# Altium schematic symbol library AA_Symbols.SchLib: 1017 symbols (part 2 of 7)
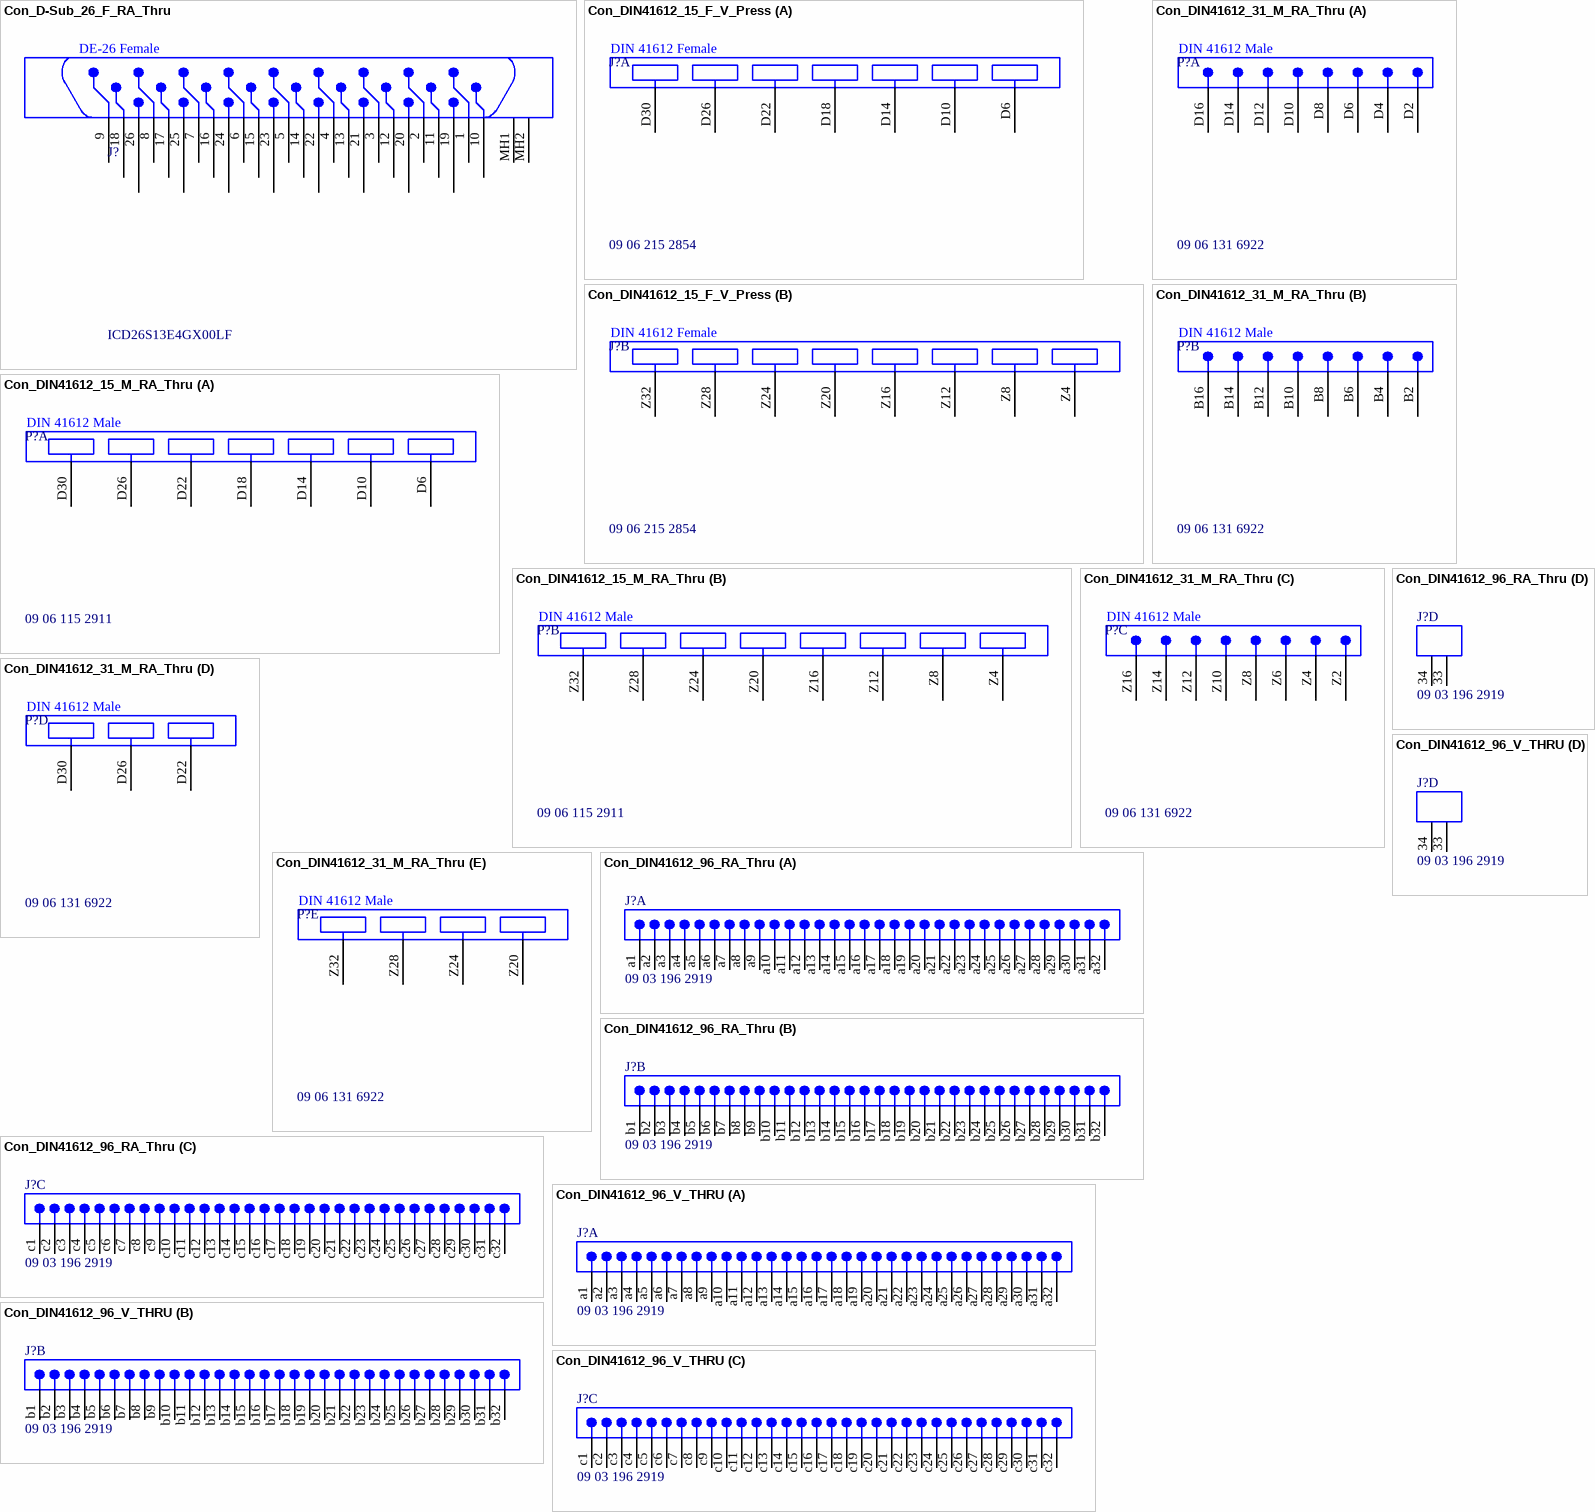
[diagram p43: symbols Con_D-Sub_26_F_RA_Thru to Con_DIN41612_96_V_THRU]

## Con_DIN41612_31_M_RA_Thru
designator P?, comment 09 06 131 6922
Connector, DIN 41612, 7 Blade + 24 Position, Male (Card Side), Right Angle, Through Hole; Manufacturer: Harting; Outset P/N: PN-0001618; Manufacturer P/N: 09 06 131 6922; Value: 09 06 131 6922
footprint 09061316922_DIN41612-24+7pin (09 06 131 6922, Board-to-Board Connector, Eurocard VME, Right Angle, 5-Row, 5.08mm and 2.54mm Pitch, 31-Position)
part A pins: D2, D4, D6, D8, D10, D12, D14, D16
part B pins: B2, B4, B6, B8, B10, B12, B14, B16
part C pins: Z2, Z4, Z6, Z8, Z10, Z12, Z14, Z16
part D pins: D22, D26, D30
part E pins: Z20, Z24, Z28, Z32
part A text: DIN 41612 Male
part B text: DIN 41612 Male
part C text: DIN 41612 Male
part D text: DIN 41612 Male
part E text: DIN 41612 Male

## Con_DIN41612_96_RA_Thru
designator J?, comment 09 03 196 2919
Connector, DIN 41612, 96 Position, Right Angle, Through Hole; Manufacturer: Molex; Manufacturer P/N: 850030567; Outset P/N: 0000041
footprint 0903196x919 (DIN 41612, 96 Position, Right angle)
part A pins: a1, a2, a3, a4, a5, a6, a7, a8, a9, a10, a11, a12, a13, a14, a15, a16, a17, a18, a19, a20, a21, a22, a23, a24, a25, a26, a27, a28, a29, a30, a31, a32
part B pins: b1, b2, b3, b4, b5, b6, b7, b8, b9, b10, b11, b12, b13, b14, b15, b16, b17, b18, b19, b20, b21, b22, b23, b24, b25, b26, b27, b28, b29, b30, b31, b32
part C pins: c1, c2, c3, c4, c5, c6, c7, c8, c9, c10, c11, c12, c13, c14, c15, c16, c17, c18, c19, c20, c21, c22, c23, c24, c25, c26, c27, c28, c29, c30, c31, c32
part D pins: 33 MH1 "Mounting Fixture", 34 MH2 "Mounting Fixture"

## Con_DIN41612_96_V_THRU
designator J?, comment 09 03 196 2919
Connector, DIN 41612, 96 Position, Vertical Through Hole; Manufacturer: Molex; Manufacturer P/N: 850420270; Outset P/N: 0000042
footprint 0903296x821 (Connector; DIN 41612, Type C, Thru-Hole; Rows a+b+c, 96 Position; Vertical)
part A pins: a1, a2, a3, a4, a5, a6, a7, a8, a9, a10, a11, a12, a13, a14, a15, a16, a17, a18, a19, a20, a21, a22, a23, a24, a25, a26, a27, a28, a29, a30, a31, a32
part B pins: b1, b2, b3, b4, b5, b6, b7, b8, b9, b10, b11, b12, b13, b14, b15, b16, b17, b18, b19, b20, b21, b22, b23, b24, b25, b26, b27, b28, b29, b30, b31, b32
part C pins: c1, c2, c3, c4, c5, c6, c7, c8, c9, c10, c11, c12, c13, c14, c15, c16, c17, c18, c19, c20, c21, c22, c23, c24, c25, c26, c27, c28, c29, c30, c31, c32
part D pins: 33 MH1 "Mounting Fixture", 34 MH2 "Mounting Fixture"

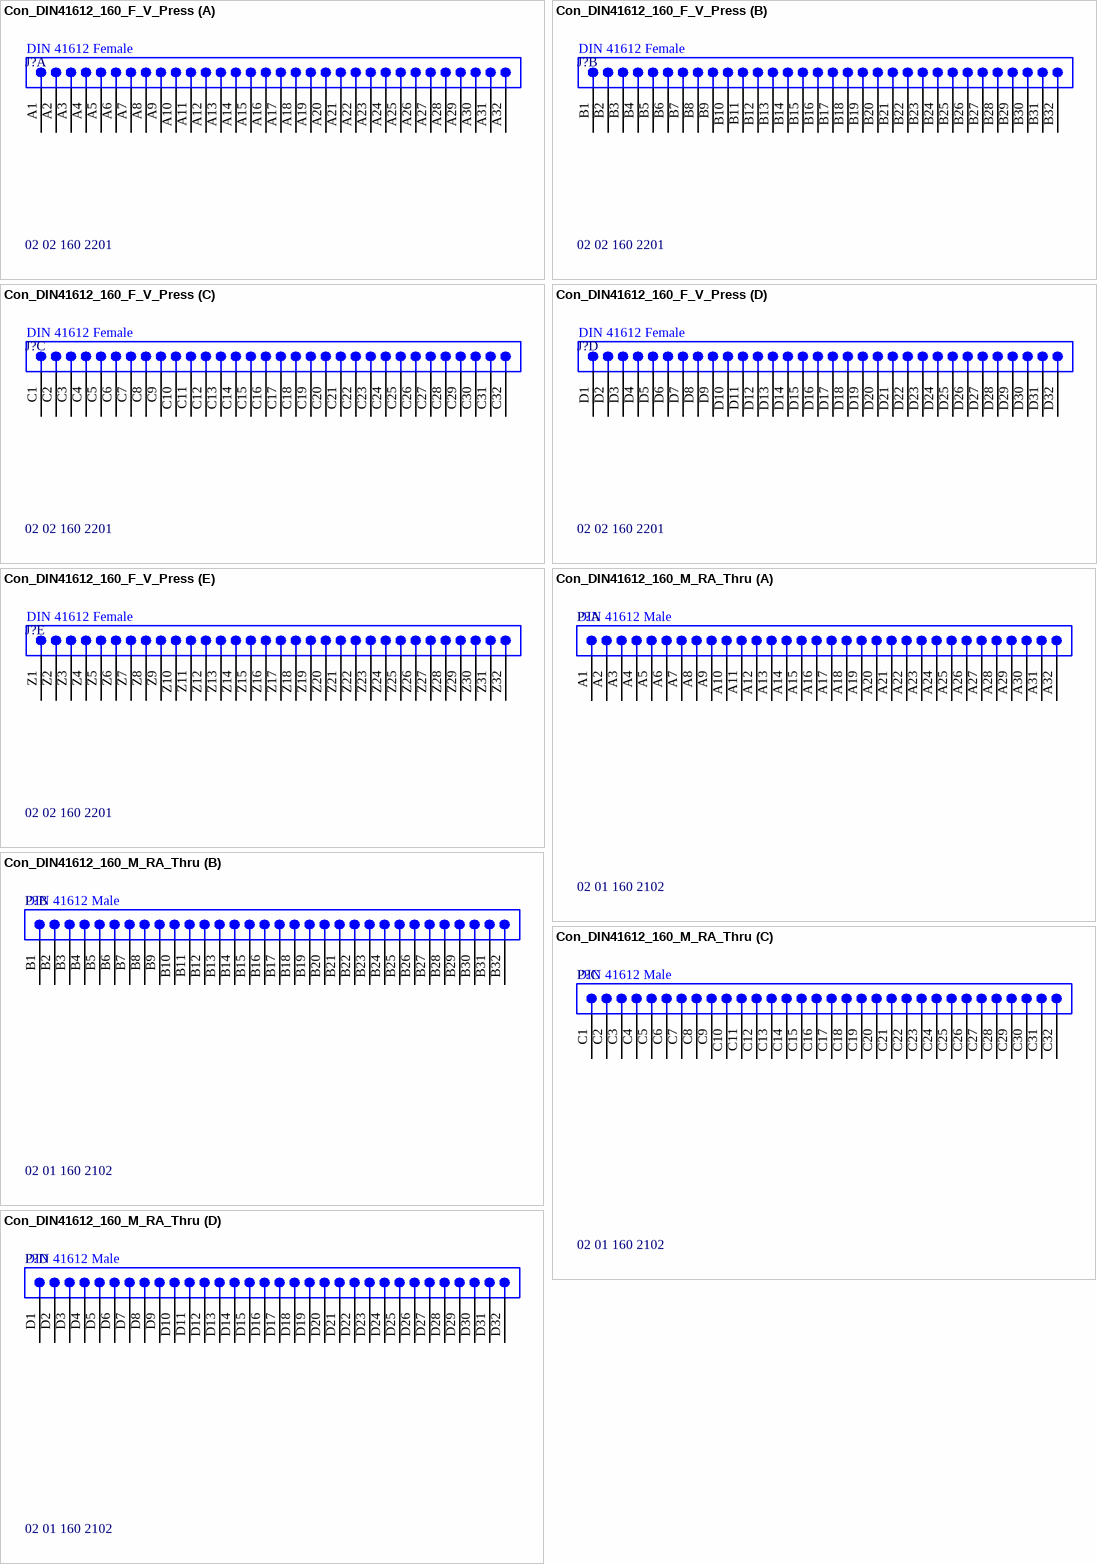
[diagram p5: symbols Con_DIN41612_160_F_V_Press to Con_DIN41612_160_M_RA_Thru]

## Con_DIN41612_160_F_V_Press
designator J?, comment 02 02 160 2201
Connector, DIN 41612, 160 Position, Female (Backplane Side), Vertical, Press Fit; Manufacturer: Harting; Outset P/N: PN-0001619; Manufacturer P/N: 02 02 160 2201; Value: 02 02 160 2201
footprint 02021602201_DIN41612-160pin (02 02 160 2201, Board-to-Board Connector, Eurocard VME, Vertical, 5-Row, Pitch 2.54mm, 160-Position)
part A pins: A1, A2, A3, A4, A5, A6, A7, A8, A9, A10, A11, A12, A13, A14, A15, A16, A17, A18, A19, A20, A21, A22, A23, A24, A25, A26, A27, A28, A29, A30, A31, A32
part B pins: B1, B2, B3, B4, B5, B6, B7, B8, B9, B10, B11, B12, B13, B14, B15, B16, B17, B18, B19, B20, B21, B22, B23, B24, B25, B26, B27, B28, B29, B30, B31, B32
part C pins: C1, C2, C3, C4, C5, C6, C7, C8, C9, C10, C11, C12, C13, C14, C15, C16, C17, C18, C19, C20, C21, C22, C23, C24, C25, C26, C27, C28, C29, C30, C31, C32
part D pins: D1, D2, D3, D4, D5, D6, D7, D8, D9, D10, D11, D12, D13, D14, D15, D16, D17, D18, D19, D20, D21, D22, D23, D24, D25, D26, D27, D28, D29, D30, D31, D32
part E pins: Z1, Z2, Z3, Z4, Z5, Z6, Z7, Z8, Z9, Z10, Z11, Z12, Z13, Z14, Z15, Z16, Z17, Z18, Z19, Z20, Z21, Z22, Z23, Z24, Z25, Z26, Z27, Z28, Z29, Z30, Z31, Z32
part A text: DIN 41612 Female
part B text: DIN 41612 Female
part C text: DIN 41612 Female
part D text: DIN 41612 Female
part E text: DIN 41612 Female

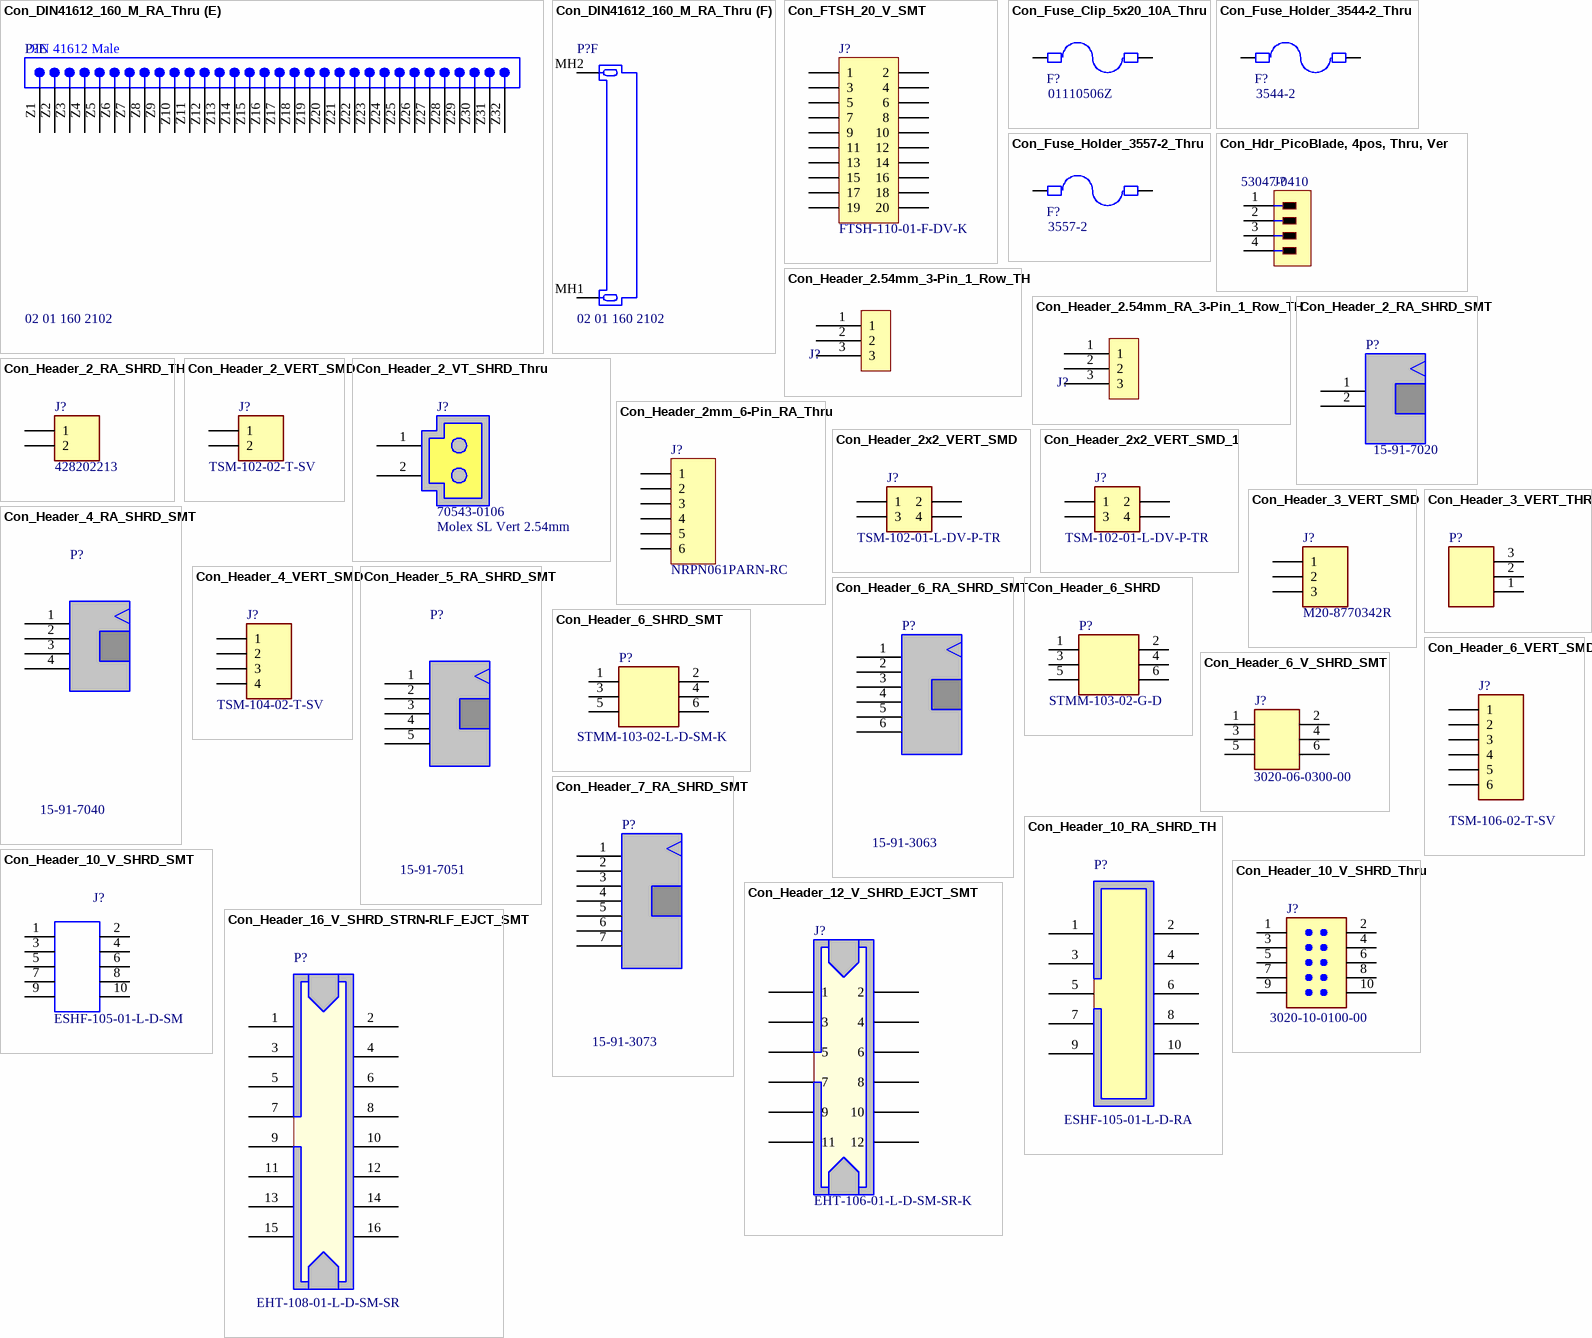
[diagram p6: symbols Con_DIN41612_160_M_RA_Thru to Con_Header_16_V_SHRD_STRN-RLF_EJCT_SMT]

## Con_DIN41612_160_M_RA_Thru
designator P?, comment 02 01 160 2102
Connector, DIN 41612, 160 Position, Male (Card Side), Right Angle, Through Hole; Manufacturer: Harting; Outset P/N: PN-0001620; Manufacturer P/N: 02 01 160 2102; Value: 02 01 160 2102
footprint 02011602102_DIN41612-160pin (02 01 160 2102, Board-to-Board Connector, Eurocard VME, Right Angle, 5-Row, Pitch 2.54mm, 160-Position)
part A pins: A1, A2, A3, A4, A5, A6, A7, A8, A9, A10, A11, A12, A13, A14, A15, A16, A17, A18, A19, A20, A21, A22, A23, A24, A25, A26, A27, A28, A29, A30, A31, A32
part B pins: B1, B2, B3, B4, B5, B6, B7, B8, B9, B10, B11, B12, B13, B14, B15, B16, B17, B18, B19, B20, B21, B22, B23, B24, B25, B26, B27, B28, B29, B30, B31, B32
part C pins: C1, C2, C3, C4, C5, C6, C7, C8, C9, C10, C11, C12, C13, C14, C15, C16, C17, C18, C19, C20, C21, C22, C23, C24, C25, C26, C27, C28, C29, C30, C31, C32
part D pins: D1, D2, D3, D4, D5, D6, D7, D8, D9, D10, D11, D12, D13, D14, D15, D16, D17, D18, D19, D20, D21, D22, D23, D24, D25, D26, D27, D28, D29, D30, D31, D32
part E pins: Z1, Z2, Z3, Z4, Z5, Z6, Z7, Z8, Z9, Z10, Z11, Z12, Z13, Z14, Z15, Z16, Z17, Z18, Z19, Z20, Z21, Z22, Z23, Z24, Z25, Z26, Z27, Z28, Z29, Z30, Z31, Z32
part F pins: MH1, MH2
part A text: DIN 41612 Male
part B text: DIN 41612 Male
part C text: DIN 41612 Male
part D text: DIN 41612 Male
part E text: DIN 41612 Male

## Con_FTSH_20_V_SMT
designator J?, comment FTSH-110-01-F-DV-K
Connector, FTSH, 20 Position, Vertical, SMT; Manufacturer: Samtec; Outset P/N: 0000043; Manufacturer P/N: FTSH-110-01-F-DV-K
footprint FTSH-110-01-F-DV-K
pins: 1, 2, 3, 4, 5, 6, 7, 8, 9, 10, 11, 12, 13, 14, 15, 16, 17, 18, 19, 20

## Con_Fuse_Clip_5x20_10A_Thru
designator F?  Manufacturer P/N: 01110506Z
Connector, Fuse Clip, 5x20, 10A, Through Hole; Manufacturer: Littelfuse Inc; Outset P/N: 0000045
footprint 5X20_CLIP_111506
pins: 1 A, 2 B

## Con_Fuse_Holder_3544-2_Thru
designator F?  Manufacturer P/N: 3544-2
Connector, Fuse Holder, 3544-2, Mini 30A, Through Hole; Manufacturer: Keystone Electronics; Outset P/N: 0000046
footprint 3544-2 (Miniature 30A Fuse Holder)
pins: 1 A, 2 B

## Con_Fuse_Holder_3557-2_Thru
designator F?  Manufacturer P/N: 3557-2
Connector, Fuse Holder, 3557-2, Mini 891 Fuse, Through Hole; Manufacturer: Keystone Electronics; Outset P/N: 0000047
footprint 3557-2 (Mini 891 Fuse Holder)
pins: 1 A, 2 B

## Con_Hdr_PicoBlade, 4pos, Thru, Ver
designator J?, comment value 53047-0410  (hidden comment: HDR, 1X4, PicoBlade, Thru, Ver)
Connector, Hdr, PicoBlade, 4pos, Thru, Ver; Manufacturer: Molex; Outset P/N: PN-0002502; Manufacturer P/N: 53047-0410; Distributor: Digi-Key
footprint CON_HDR_1X4_PICOBL_53047-0410 (Con, Hdr, 1x4, PicoBlade, Thru, Vert)
pins: 1, 2, 3, 4

## Con_Header_2.54mm_3-Pin_1_Row_TH
designator J?, comment 0022284035  (value not drawn)
Connector, Header, 2.54mm Pitch, 3-Pin, 1-Row, TH, Straight, Unshrouded; Manufacturer: Molex; Outset P/N: PN-0006346; Manufacturer P/N: 0022284035
footprint HEADER_3-POS_1-ROW_TH (Header, 3-Pos, 1-Row, TH)
pins: 1, 2, 3

## Con_Header_2.54mm_RA_3-Pin_1_Row_TH
designator J?, comment 0022288034  (value not drawn)
Connector, Header, 2.54mm Pitch, 3-Pin, 1-Row, TH, Straight, Unshrouded; Manufacturer: Molex; Outset P/N: PN-0008353; Manufacturer P/N: 0022288034
footprint 22-28-8034_MOL
pins: 1, 2, 3

## Con_Header_2_RA_SHRD_SMT
designator P?, comment 15-91-7020
Connector, Header, 2x1Position, Right Angle, Shrowded, Surface Mount; Manufacturer: Molex; Outset P/N: PN-0001746; Manufacturer P/N: 15-91-7020; Value: 15-91-7020
footprint 15-91-7020_2.5mm2pin (Footprint not found)
pins: 1, 2

## Con_Header_2_RA_SHRD_TH
designator J?, comment 428202213
Connector, Header, 2x1 Position, 0.394" (10mm) Pitch, Right Angle, Shrouded, Through Hole; Manufacturer: Molex; Outset P/N: PN-0007272; Manufacturer P/N: 428202213; Value: 428202213
footprint CON_2_RA_MiniFit_SR
pins: 1, 2

## Con_Header_2_VERT_SMD
designator J?, comment TSM-102-02-T-SV
Connector, Header Surface Mount 2 position 0.100" (2.54mm); Manufacturer: Samtec Inc.; Outset P/N: PN-0008198; Manufacturer P/N: TSM-102-02-T-SV; Supplier 1: Digi-Key; Supplier Part Number 1: SAM15347-ND; Value: TSM-102-02-T-SV
footprint SAMTEC_TSM-102-02-T-SV
pins: 1, 2

## Con_Header_2_VT_SHRD_Thru
designator J?, comment Manufacturer P/N: 70543-0106  (hidden comment: Molex SL Vert 2.54mm)
Connector 2.54mm SL, Header, 2x1 Position, Vertical, Shrouded, Through Hole; Outset P/N: PN-0001759; Manufacturer: Molex; Value: Molex SL Vert 2.54mm
footprint 705430001_2.54mm2pin (Footprint not found)
pins: 1, 2

## Con_Header_2mm_6-Pin_RA_Thru
designator J?, comment NRPN061PARN-RC
Connector, Header, 2mm, 6 Position, Right Angle, Through-Hole; Manufacturer: Sullins Connector Solutions; Outset P/N: 0000048; Manufacturer P/N: NRPN061PARN-RC
footprint HEADER_6PIN_2MM_RA
pins: 1, 2, 3, 4, 5, 6

## Con_Header_2x2_VERT_SMD
designator J?, comment TSM-102-01-L-DV-P-TR
Connector Header Surface Mount 4 position 0.100" (2.54mm); Manufacturer: Samtec Inc.; Outset P/N: PN-0008386; Manufacturer P/N: TSM-102-01-L-DV-P-TR; Supplier 1: Digi-Key; Supplier Part Number 1: SAM15347-ND; Value: TSM-102-01-L-DV-P-TR
pins: 1, 2, 3, 4

## Con_Header_2x2_VERT_SMD_1
designator J?, comment TSM-102-01-L-DV-P-TR
Connector Header Surface Mount 4 position 0.100" (2.54mm); Manufacturer: Samtec Inc.; Manufacturer P/N: TSM-102-02-T-SV; Supplier 1: Digi-Key; Supplier Part Number 1: SAM15347-ND; Value: TSM-102-01-L-DV-P-TR
pins: 1, 2, 3, 4

## Con_Header_3_VERT_SMD
designator J?, comment M20-8770342R
Connector, Header Surface Mount 3 position 0.100" (2.54mm); Manufacturer: Harwin Inc.; Outset P/N: PN-0008196; Manufacturer P/N: M20-8770342R; Value: M20-8770342R
footprint CON_VERT_3
pins: 1, 2, 3

## Con_Header_3_VERT_THRU
designator P?, comment 70543-0107  (value not drawn)
CONN HEADER VERT 3POS 2.54MM; Manufacturer: Molex; Outset P/N: PN-0008338; TEMPERATURE: -40°C ~ 105°C; VALUE: 70543-0107; Manufacturer P/N: 70543-0107
footprint 70543-0107
pins: 1, 2, 3

## Con_Header_4_RA_SHRD_SMT
designator P?, comment 15-91-7040
Connector, Header, 4x1Position, Right Angle, Shrowded, Surface Mount; Manufacturer: Molex; Outset P/N: PN-0001740; Manufacturer P/N: 15-91-7040; Value: 15-91-7040
footprint 15-91-7040_2.5mm4pin (Footprint not found)
pins: 1, 2, 3, 4

## Con_Header_4_VERT_SMD
designator J?, comment TSM-104-02-T-SV
Connector, Header Surface Mount 4 position 0.100" (2.54mm); Manufacturer: Samtec Inc.; Outset P/N: PN-0008199; Supplier 1: Samtec; Manufacturer P/N: TSM-104-02-T-SV; Supplier Part Number 1: TSM-104-02-T-SV; Value: TSM-104-02-T-SV
footprint SAMTEC_TSM-104-02-T-SV
pins: 1, 2, 3, 4

## Con_Header_5_RA_SHRD_SMT
designator P?, comment 15-91-7051
Connector, Header, 5x1Position, Right Angle, Shrowded, Surface Mount; Manufacturer: Molex; Outset P/N: PN-0001748; Manufacturer P/N: 15-91-7051; Value: 15-91-7051
footprint 15-91-7051_2.5mm5pin (Connector, Header, 5x1Position, Right Angle, Shrowded, Surface Mount, Press-fit Pegs)
pins: 1, 2, 3, 4, 5

## Con_Header_6_RA_SHRD_SMT
designator P?, comment 15-91-3063
Connector, Header, 6x1Position, Right Angle, Shrowded, Surface Mount; Manufacturer: Molex; Outset P/N: PN-0001752; Manufacturer P/N: 15-91-3063; Value: 15-91-3063
footprint 15913063_2.5mm6pin (Footprint not found)
pins: 1, 2, 3, 4, 5, 6

## Con_Header_6_SHRD
designator P?, comment value STMM-103-02-G-D  (hidden comment: STMM-103-02-L-D-SM-K-ND)
Connector Header Through Hole 6 position 0.079" (2.00mm); Manufacturer: Samtec; Outset P/N: PN-0007425; Manufacturer P/N: STMM-103-02-G-D
footprint CONN_SAMTEC_STMM-103-02-G-D (Connector Header Through Hole 6 position 0.079" (2.00mm))
pins: 1, 2, 3, 4, 5, 6

## Con_Header_6_SHRD_SMT
designator P?, comment value STMM-103-02-L-D-SM-K  (hidden comment: STMM-103-02-L-D-SM-K-ND)
Connector, Header, 3x2Position, 0.079" (2.00mm) Pitch, Shrouded, Surface Mount; Manufacturer: Samtec; Outset P/N: PN-0007154; Manufacturer P/N: STMM-103-02-L-D-SM-K
footprint CONN_SAMTEC_STMM-103-02-L-D-SM
pins: 1, 2, 3, 4, 5, 6

## Con_Header_6_V_SHRD_SMT
designator J?, comment 3020-06-0300-00
Connector, Header, 3x2Position, 2.54mm Pitch, Vertical, Shrouded, SMT; Manufacturer: CNC Tech; Outset P/N: PN-0007145; Manufacturer P/N: 3020-06-0300-00; VALUE: 3020-06-0300-00
footprint CON_3020-06-0300-00
pins: 1, 2, 3, 4, 5, 6

## Con_Header_6_VERT_SMD
designator J?, comment TSM-106-02-T-SV
Connector, Header Surface Mount 6 position 0.100" (2.54mm); Manufacturer: Samtec Inc.; Outset P/N: PN-0008200; Manufacturer P/N: TSM-106-02-T-SV; Supplier 1: Digi-Key; Supplier Part Number 1: SAM12247-ND; Value: TSM-106-02-T-SV
pins: 1, 2, 3, 4, 5, 6

## Con_Header_7_RA_SHRD_SMT
designator P?, comment 15-91-3073
Connector, Header, 7x1Position, Right Angle, Shrowded, Surface Mount; Manufacturer: Molex; Outset P/N: PN-0001761; Manufacturer P/N: 15-91-3073; Value: 15-91-3073
footprint 15-91-3073_2.5mm7pin (Footprint not found)
pins: 1, 2, 3, 4, 5, 6, 7

## Con_Header_10_RA_SHRD_TH
designator P?, comment ESHF-105-01-L-D-RA
Connector, Header, 50mil pitch, 5x2 Position, Right Angle, Shrouded, Through Hole; Manufacturer: Samtec; Outset P/N: PN-0001621; Manufacturer P/N: ESHF-105-01-L-D-RA; Value: ESHF-105-01-L-D-RA
footprint ESHF-105-01-L-D-RA_50mil2x5pin (Connector, Header, 15x2Position, Vertical, Shrowded, Eject Hooks, Surface Mount, Pitch 2.00mm, 15-Position)
pins: 1, 2, 3, 4, 5, 6, 7, 8, 9, 10

## Con_Header_10_V_SHRD_SMT
designator J?, comment ESHF-105-01-L-D-SM
Connector, Header, 5x2Position, 0.050" (1.27mm) Pitch, Vertical, Shrouded, Surface Mount; Manufacturer: Samtec Inc.; Outset P/N: PN-0007149; Manufacturer P/N: ESHF-105-01-L-D-SM; VALUE: ESHF-105-01-L-D-SM
footprint CON_ESHF-105-01-X-D-SM
pins: 1, 2, 3, 4, 5, 6, 7, 8, 9, 10

## Con_Header_10_V_SHRD_Thru
designator J?, comment 3020-10-0100-00
Connector, Header, 5x2Position, 2.54mm Pitch, Vertical, Shrouded; Manufacturer: CNC Tech; Outset P/N: PN-0007135; Manufacturer P/N: 3020-10-0100-00; VALUE: 3020-10-0100-00
footprint CONN_TH_CNC_3020-10-0100-00
pins: 1, 2, 3, 4, 5, 6, 7, 8, 9, 10

## Con_Header_12_V_SHRD_EJCT_SMT
designator J?, comment EHT-106-01-L-D-SM-SR-K
Connector, Header, 6x2Position, Vertical, Shrouded, Eject Hooks, Surface Mount; Manufacturer: Samtec; Outset P/N: PN-0001802; Manufacturer P/N: EHT-106-01-L-D-SM-SR-K; Value: *
footprint EHT-106-01-L-D-SM-SR-K (Connector, Header, 6x2Position, Vertical, Shrowded, Eject Hooks, Surface Mount, Pitch 2.00mm, 12-Position)
pins: 1, 2, 3, 4, 5, 6, 7, 8, 9, 10, 11, 12

## Con_Header_16_V_SHRD_STRN-RLF_EJCT_SMT
designator P?, comment EHT-108-01-L-D-SM-SR
Connector, Header, 8x2Position, Vertical, Shrowded, Strain Relief, Eject Hooks, Surface Mount; Manufacturer: Samtec; Outset P/N: PN-0001743; Value: EHT-108-01-L-D-SM-SR; Manufacturer P/N: EHT-108-01-L-D-SM-SR
footprint EHT-108-01-L-D-SM-SR-LC_2mm2x8pin (Connector, Header, 8x2Position, Vertical, Shrowded, Eject Hooks, Surface Mount, Pitch 2.00mm, 16-Position)
pins: 1, 2, 3, 4, 5, 6, 7, 8, 9, 10, 11, 12, 13, 14, 15, 16

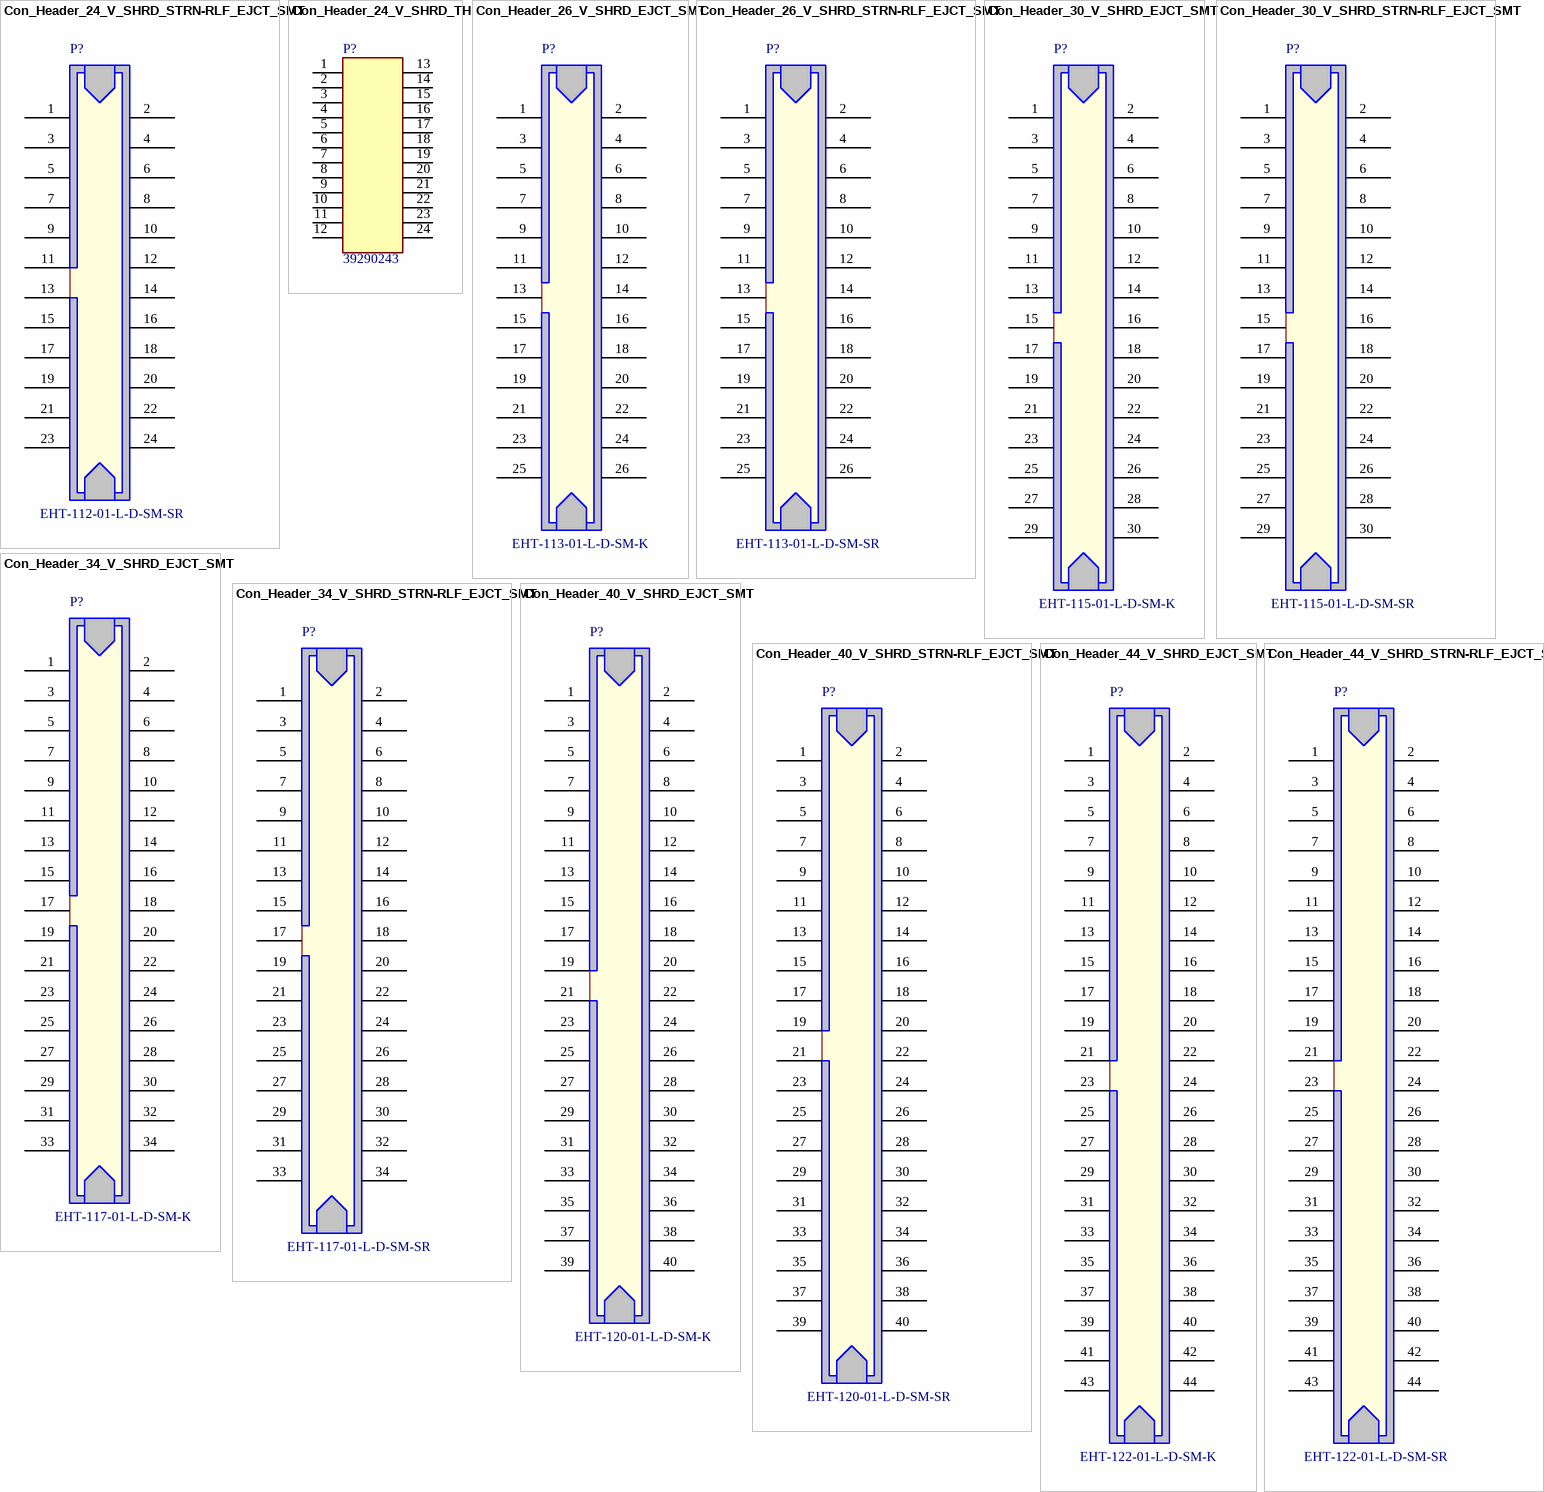
[diagram p7: symbols Con_Header_24_V_SHRD_STRN-RLF_EJCT_SMT to Con_Header_44_V_SHRD_STRN-RLF_EJCT_SMT]

## Con_Header_24_V_SHRD_STRN-RLF_EJCT_SMT
designator P?, comment EHT-112-01-L-D-SM-SR
Connector, Header, 12x2Position, Vertical, Shrowded, Strain Relief, Eject Hooks, Surface Mount; Manufacturer: Samtec; Outset P/N: PN-0001683; Value: EHT-112-01-L-D-SM-SR; Manufacturer P/N: EHT-112-01-L-D-SM-SR
footprint EHT-112-01-L-D-SM-SR-LC_2mm2x13pin (Connector, Header, 12x2Position, Vertical, Shrowded, Strain Relief, Eject Hooks, Surface Mount)
pins: 1, 2, 3, 4, 5, 6, 7, 8, 9, 10, 11, 12, 13, 14, 15, 16, 17, 18, 19, 20, 21, 22, 23, 24

## Con_Header_24_V_SHRD_TH
designator P?, comment 39290243
Connector, Header, 12x2 Position, 0.165" (4.20mm) Pitch, Vertical, Shrouded, Through Hole; Manufacturer: Molex; Outset P/N: PN-0007274; VALUE: 39290243; Manufacturer P/N: 39290243
footprint SHDRV24W100P420_12X2_5160X960H1310N (Header, Vertical Shroulded, 4.20 mm pitch; 1.10 mm lead width, 24 pins, 2 rows, 12 pins per row, 51.60 mm L X 9.60 mm W X 13.10 mm H Body)
pins: 1, 2, 3, 4, 5, 6, 7, 8, 9, 10, 11, 12, 13, 14, 15, 16, 17, 18, 19, 20, 21, 22, 23, 24

## Con_Header_26_V_SHRD_EJCT_SMT
designator P?, comment EHT-113-01-L-D-SM-K
Connector, Header, 2mm pitch, 13x2Position, Vertical, Shrouded, Eject Hooks, Surface Mount; Manufacturer: Samtec; Outset P/N: PN-0001683; Value: EHT-113-01-L-D-SM-K; Manufacturer P/N: EHT-113-01-L-D-SM-K
footprint EHT-113-01-L-D-SM-LC-K_2mm2x13pin (Connector, Header, 13x2Position, Vertical, Shrowded, Eject Hooks, Surface Mount, Pitch 2.00mm, 13-Position)
pins: 1, 2, 3, 4, 5, 6, 7, 8, 9, 10, 11, 12, 13, 14, 15, 16, 17, 18, 19, 20, 21, 22, 23, 24, 25, 26

## Con_Header_26_V_SHRD_STRN-RLF_EJCT_SMT
designator P?, comment EHT-113-01-L-D-SM-SR
Connector, Header, 13x2Position, Vertical, Shrowded, Strain Relief, Eject Hooks, Surface Mount; Manufacturer: Samtec; Outset P/N: PN-0001714; Value: EHT-113-01-L-D-SM-SR; Manufacturer P/N: EHT-113-01-L-D-SM-SR
footprint EHT-113-01-L-D-SM-SR-LC_2mm2x13pin (Connector, Header, 13x2Position, Vertical, Shrowded, Strain Relief, Eject Hooks, Surface Mount)
pins: 1, 2, 3, 4, 5, 6, 7, 8, 9, 10, 11, 12, 13, 14, 15, 16, 17, 18, 19, 20, 21, 22, 23, 24, 25, 26

## Con_Header_30_V_SHRD_EJCT_SMT
designator P?, comment EHT-115-01-L-D-SM-K
Connector, Header, 2mm pitch, 15x2Position, Vertical, Shrouded, Eject Hooks, Surface Mount; Manufacturer: Samtec; Outset P/N: PN-0001622; Value: EHT-115-01-L-D-SM-K; Manufacturer P/N: EHT-115-01-L-D-SM-K
footprint EHT-115-01-L-D-SM-LC-K_2mm2x15pin (Connector, Header, 15x2Position, Vertical, Shrowded, Eject Hooks, Surface Mount, Pitch 2.00mm, 15-Position)
pins: 1, 2, 3, 4, 5, 6, 7, 8, 9, 10, 11, 12, 13, 14, 15, 16, 17, 18, 19, 20, 21, 22, 23, 24, 25, 26, 27, 28, 29, 30

## Con_Header_30_V_SHRD_STRN-RLF_EJCT_SMT
designator P?, comment EHT-115-01-L-D-SM-SR
Connector, Header, 15x2Position, Vertical, Shrowded, Strain Relief, Eject Hooks, Surface Mount; Manufacturer: Samtec; Outset P/N: PN-0001713; Value: EHT-115-01-L-D-SM-SR; Manufacturer P/N: EHT-115-01-L-D-SM-SR
footprint EHT-115-01-L-D-SM-SR-LC_2mm2x15pin (Connector, Header, 15x2Position, Vertical, Shrowded, Strain Relief, Eject Hooks, Surface Mount)
footprint EHT-115-01-L-D-SM-SR_2mm2x15pin (Connector, Header, 15x2Position, Vertical, Shrowded, Strain Relief, Eject Hooks, Surface Mount)
pins: 1, 2, 3, 4, 5, 6, 7, 8, 9, 10, 11, 12, 13, 14, 15, 16, 17, 18, 19, 20, 21, 22, 23, 24, 25, 26, 27, 28, 29, 30

## Con_Header_34_V_SHRD_EJCT_SMT
designator P?, comment EHT-117-01-L-D-SM-K
Connector, Header, 2mm pitch, 17x2Position, Vertical, Shrouded, Eject Hooks, Surface Mount; Manufacturer: Samtec; Outset P/N: PN-0001623; Value: EHT-117-01-L-D-SM-K; Manufacturer P/N: EHT-117-01-L-D-SM-K
footprint EHT-117-01-L-D-SM-LC-K_2mm2x17pin (Connector, Header, 17x2Position, Vertical, Shrowded, Eject Hooks, Surface Mount)
pins: 1, 2, 3, 4, 5, 6, 7, 8, 9, 10, 11, 12, 13, 14, 15, 16, 17, 18, 19, 20, 21, 22, 23, 24, 25, 26, 27, 28, 29, 30, 31, 32, 33, 34

## Con_Header_34_V_SHRD_STRN-RLF_EJCT_SMT
designator P?, comment EHT-117-01-L-D-SM-SR
Connector, Header, 17x2Position, Vertical, Shrowded, Strain Relief, Eject Hooks, Surface Mount; Manufacturer: Samtec; Outset P/N: PN-0001712; Value: EHT-117-01-L-D-SM-SR; Manufacturer P/N: EHT-117-01-L-D-SM-SR
footprint EHT-117-01-L-D-SM-SR-LC_2mm2x17pin (Connector, Header, 17x2Position, Vertical, Shrowded, Strain Relief, Eject Hooks, Surface Mount)
pins: 1, 2, 3, 4, 5, 6, 7, 8, 9, 10, 11, 12, 13, 14, 15, 16, 17, 18, 19, 20, 21, 22, 23, 24, 25, 26, 27, 28, 29, 30, 31, 32, 33, 34

## Con_Header_40_V_SHRD_EJCT_SMT
designator P?, comment EHT-120-01-L-D-SM-K
Connector, Header, 2mm pitch, 20x2Position, Vertical, Shrouded, Eject Hooks, Surface Mount; Manufacturer: Samtec; Outset P/N: PN-0001624; Value: EHT-120-01-L-D-SM-K; Manufacturer P/N: EHT-120-01-L-D-SM-K
footprint EHT-120-01-L-D-SM-LC-K_2mm2x20pin (Connector, Header, 20x2Position, Vertical, Shrowded, Eject Hooks, Surface Mount)
pins: 1, 2, 3, 4, 5, 6, 7, 8, 9, 10, 11, 12, 13, 14, 15, 16, 17, 18, 19, 20, 21, 22, 23, 24, 25, 26, 27, 28, 29, 30, 31, 32, 33, 34, 35, 36, 37, 38, 39, 40

## Con_Header_40_V_SHRD_STRN-RLF_EJCT_SMT
designator P?, comment EHT-120-01-L-D-SM-SR
Connector, Header, 20x2Position, Vertical, Shrowded, Strain Relief, Eject Hooks, Surface Mount; Manufacturer: Samtec; Outset P/N: PN-0001711; Value: EHT-120-01-L-D-SM-SR; Manufacturer P/N: EHT-120-01-L-D-SM-SR
footprint EHT-120-01-L-D-SM-SR_2mm2x20pin (Connector, Header, 20x2Position, Vertical, Shrowded, Strain Relief, Eject Hooks, Surface Mount)
pins: 1, 2, 3, 4, 5, 6, 7, 8, 9, 10, 11, 12, 13, 14, 15, 16, 17, 18, 19, 20, 21, 22, 23, 24, 25, 26, 27, 28, 29, 30, 31, 32, 33, 34, 35, 36, 37, 38, 39, 40

## Con_Header_44_V_SHRD_EJCT_SMT
designator P?, comment EHT-122-01-L-D-SM-K
Connector, Header, 2mm pitch, 22x2Position, Vertical, Shrouded, Eject Hooks, Surface Mount; Manufacturer: Samtec; Outset P/N: PN-0001625; Value: EHT-122-01-L-D-SM-K; Manufacturer P/N: EHT-122-01-L-D-SM-K
footprint EHT-122-01-L-D-SM-LC-K_2mm2x22pin (Connector, Header, 22x2Position, Vertical, Shrowded, Eject Hooks, Surface Mount)
pins: 1, 2, 3, 4, 5, 6, 7, 8, 9, 10, 11, 12, 13, 14, 15, 16, 17, 18, 19, 20, 21, 22, 23, 24, 25, 26, 27, 28, 29, 30, 31, 32, 33, 34, 35, 36, 37, 38, 39, 40, 41, 42, 43, 44

## Con_Header_44_V_SHRD_STRN-RLF_EJCT_SMT
designator P?, comment EHT-122-01-L-D-SM-SR
Connector, Header, 22x2Position, Vertical, Shrowded, Strain Relief, Eject Hooks, Surface Mount; Manufacturer: Samtec; Outset P/N: PN-0001710; Value: EHT-122-01-L-D-SM-SR; Manufacturer P/N: EHT-122-01-L-D-SM-SR
footprint EHT-122-01-L-D-SM-SR-LC_2mm2x22pin (Connector, Header, 22x2Position, Vertical, Shrowded, Strain Relief, Eject Hooks, Surface Mount)
pins: 1, 2, 3, 4, 5, 6, 7, 8, 9, 10, 11, 12, 13, 14, 15, 16, 17, 18, 19, 20, 21, 22, 23, 24, 25, 26, 27, 28, 29, 30, 31, 32, 33, 34, 35, 36, 37, 38, 39, 40, 41, 42, 43, 44

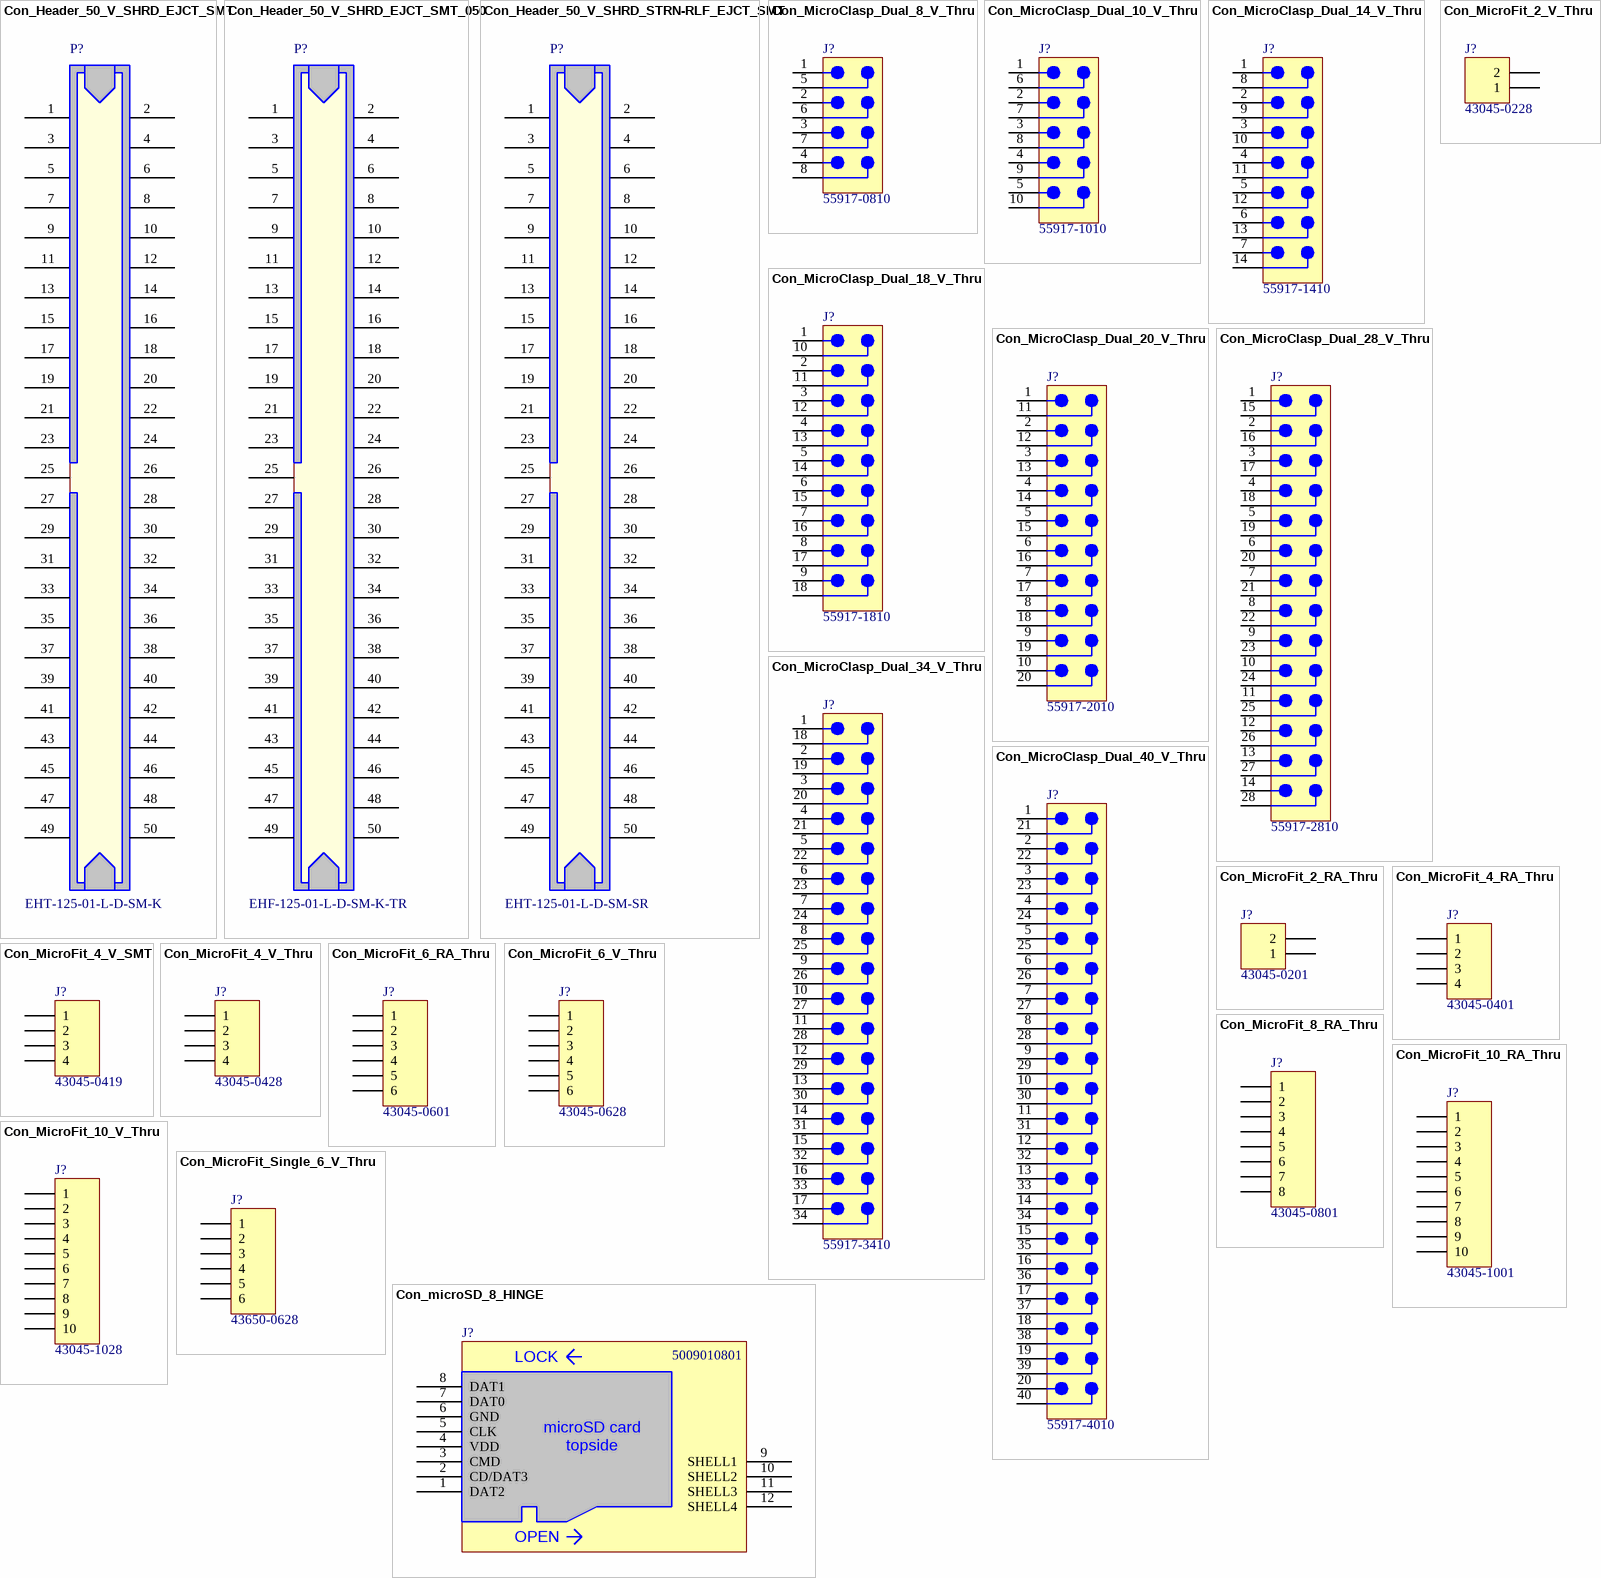
[diagram p8: symbols Con_Header_50_V_SHRD_EJCT_SMT to Con_microSD_8_HINGE]

## Con_Header_50_V_SHRD_EJCT_SMT
designator P?, comment EHT-125-01-L-D-SM-K
Connector, Header, 2mm pitch, 25x2Position, Vertical, Shrouded, Eject Hooks, Surface Mount; Manufacturer: Samtec; Outset P/N: PN-0001626; Value: EHT-125-01-L-D-SM-K; Manufacturer P/N: EHT-125-01-L-D-SM-K
footprint EHT-125-01-L-D-SM-LC-K_2mm2x25pin (Connector, Header, 25x2Position, Vertical, Shrowded, Eject Hooks, Surface Mount)
pins: 1, 2, 3, 4, 5, 6, 7, 8, 9, 10, 11, 12, 13, 14, 15, 16, 17, 18, 19, 20, 21, 22, 23, 24, 25, 26, 27, 28, 29, 30, 31, 32, 33, 34, 35, 36, 37, 38, 39, 40, 41, 42, 43, 44, 45, 46, 47, 48, 49, 50

## Con_Header_50_V_SHRD_EJCT_SMT_050
designator P?, comment EHF-125-01-L-D-SM-K-TR
Connector, Header, 1.27mm pitch, 25x2Position, Vertical, Shrouded, Eject Hooks, Surface Mount; Manufacturer: Samtec; Outset P/N: PN-0008153; Value: EHF-125-01-L-D-SM-K-TR; Manufacturer P/N: EHF-125-01-L-D-SM-K-TR
footprint SAMTEC_EHF-125-01-L-D-SM-P
pins: 1, 2, 3, 4, 5, 6, 7, 8, 9, 10, 11, 12, 13, 14, 15, 16, 17, 18, 19, 20, 21, 22, 23, 24, 25, 26, 27, 28, 29, 30, 31, 32, 33, 34, 35, 36, 37, 38, 39, 40, 41, 42, 43, 44, 45, 46, 47, 48, 49, 50
